# Altium integrated library WCAP-ATLL_rev15a.intlib: 209 symbols (part 1 of 3)
Pins are listed as number, name and electrical type; pins without a type are passive.

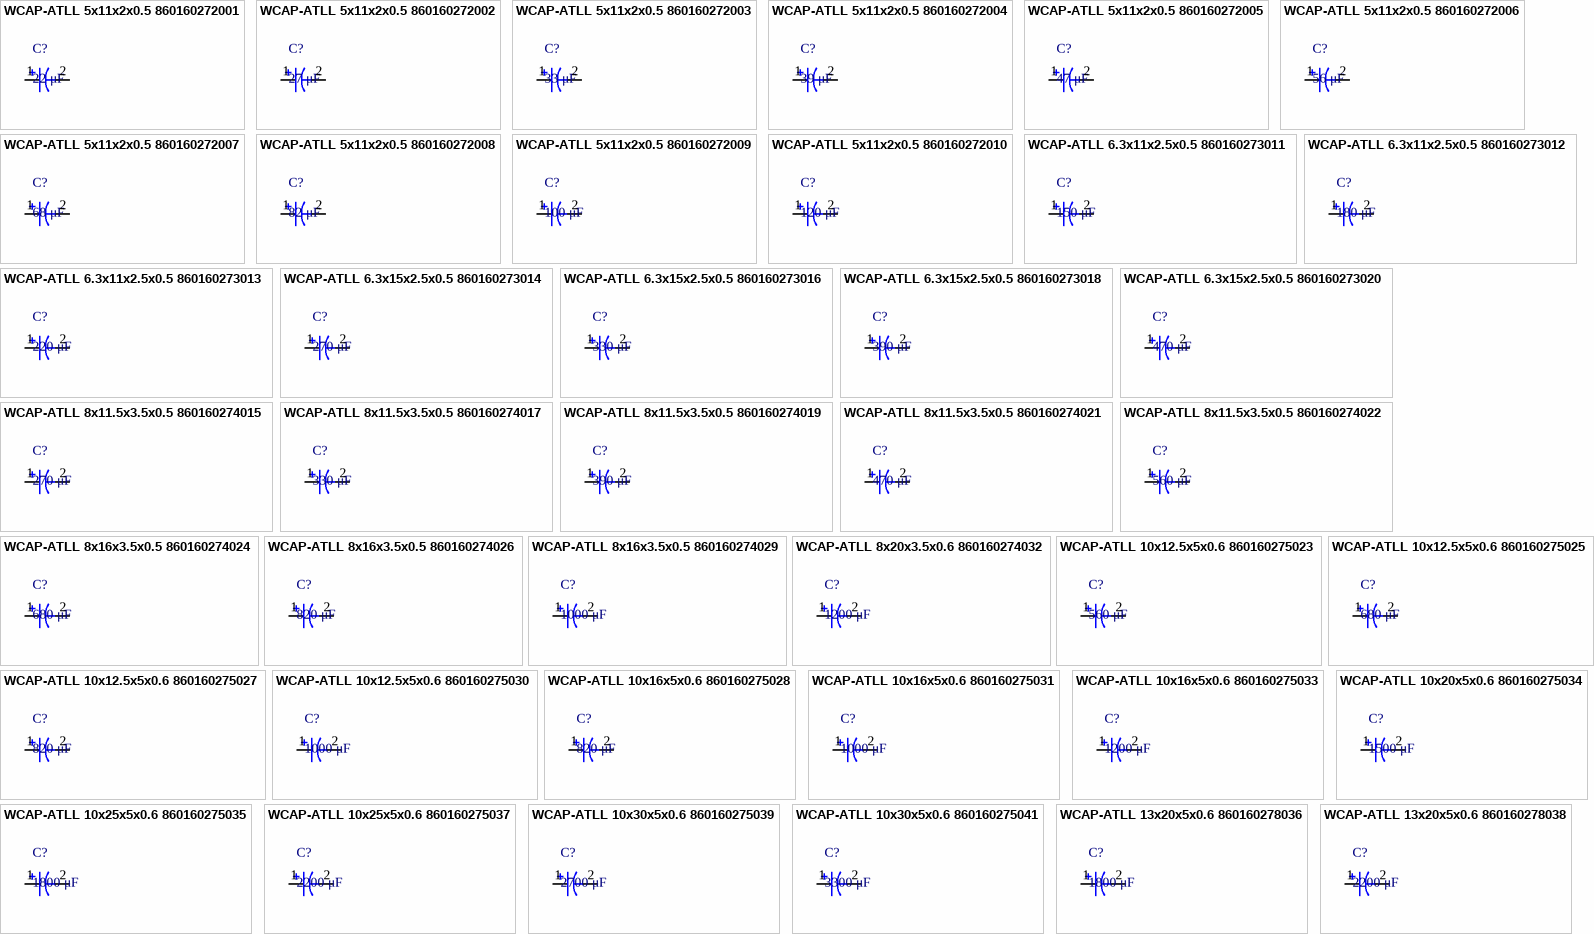
[diagram p0: symbols WCAP-ATLL 5x11x2x0.5 860160272001 to WCAP-ATLL 13x20x5x0.6 860160278038]

## WCAP-ATLL 5x11x2x0.5 860160272001
designator C?, comment 22 μF
WCAP-ATLL Aluminum Electrolytic Capacitors , 22 μF; + / - 20%; 10 V , 5 x 11; Manufacturer: Wurth Elektronik; partNo: 860160272001; E-mail: libraries@we-online.com; Characteristics: Aluminum Electrolytic Capacitor;Recommended soldering: Wave;Operating temperature: –55 °C to +105 °C;Low impedance and high temperature product series;Load life: 3000–10000 h @ +105 °C; ComponentLink1Description: Manufacturer; ComponentLink1URL: http://www.we-online.com; ComponentLink2Description: Datasheet; ComponentLink2URL: http://katalog.we-online.de/pbs/datasheet/860160272001.pdf; Created by: Karrer Zheng; Created Date: 5/13/2015; Capacitance: 22 μF; Application: Used in circuit with rigorous conditions and high ambient temperature;  applied to the secondary side output filtering loop, used in switching power supply with higher operating temperature, DC-DC converter, AC-DC converter, adapter, charger, TV, VCR, DC motor circuit filter, high-end switching power supply, LCD TV, energy saving lamps, electronic ballast, LED lamp and etc.
footprint WCAP-ATLL 5x11x2x0.5
pins: 1, 2

## WCAP-ATLL 5x11x2x0.5 860160272002
designator C?, comment 27 μF
WCAP-ATLL Aluminum Electrolytic Capacitors , 27 μF; + / - 20%; 10 V , 5 x 11; Manufacturer: Wurth Elektronik; partNo: 860160272002; E-mail: libraries@we-online.com; Characteristics: Aluminum Electrolytic Capacitor;Recommended soldering: Wave;Operating temperature: –55 °C to +105 °C;Low impedance and high temperature product series;Load life: 3000–10000 h @ +105 °C; ComponentLink1Description: Manufacturer; ComponentLink1URL: http://www.we-online.com; ComponentLink2Description: Datasheet; ComponentLink2URL: http://katalog.we-online.de/pbs/datasheet/860160272002.pdf; Created by: Karrer Zheng; Created Date: 5/13/2015; Capacitance: 27 μF; Application: Used in circuit with rigorous conditions and high ambient temperature;  applied to the secondary side output filtering loop, used in switching power supply with higher operating temperature, DC-DC converter, AC-DC converter, adapter, charger, TV, VCR, DC motor circuit filter, high-end switching power supply, LCD TV, energy saving lamps, electronic ballast, LED lamp and etc.
footprint WCAP-ATLL 5x11x2x0.5
pins: 1, 2

## WCAP-ATLL 5x11x2x0.5 860160272003
designator C?, comment 33 μF
WCAP-ATLL Aluminum Electrolytic Capacitors , 33 μF; + / - 20%; 10 V , 5 x 11; Manufacturer: Wurth Elektronik; partNo: 860160272003; E-mail: libraries@we-online.com; Characteristics: Aluminum Electrolytic Capacitor;Recommended soldering: Wave;Operating temperature: –55 °C to +105 °C;Low impedance and high temperature product series;Load life: 3000–10000 h @ +105 °C; ComponentLink1Description: Manufacturer; ComponentLink1URL: http://www.we-online.com; ComponentLink2Description: Datasheet; ComponentLink2URL: http://katalog.we-online.de/pbs/datasheet/860160272003.pdf; Created by: Karrer Zheng; Created Date: 5/13/2015; Capacitance: 33 μF; Application: Used in circuit with rigorous conditions and high ambient temperature;  applied to the secondary side output filtering loop, used in switching power supply with higher operating temperature, DC-DC converter, AC-DC converter, adapter, charger, TV, VCR, DC motor circuit filter, high-end switching power supply, LCD TV, energy saving lamps, electronic ballast, LED lamp and etc.
footprint WCAP-ATLL 5x11x2x0.5
pins: 1, 2

## WCAP-ATLL 5x11x2x0.5 860160272004
designator C?, comment 39 μF
WCAP-ATLL Aluminum Electrolytic Capacitors , 39 μF; + / - 20%; 10 V , 5 x 11; Manufacturer: Wurth Elektronik; partNo: 860160272004; E-mail: libraries@we-online.com; Characteristics: Aluminum Electrolytic Capacitor;Recommended soldering: Wave;Operating temperature: –55 °C to +105 °C;Low impedance and high temperature product series;Load life: 3000–10000 h @ +105 °C; ComponentLink1Description: Manufacturer; ComponentLink1URL: http://www.we-online.com; ComponentLink2Description: Datasheet; ComponentLink2URL: http://katalog.we-online.de/pbs/datasheet/860160272004.pdf; Created by: Karrer Zheng; Created Date: 5/13/2015; Capacitance: 39 μF; Application: Used in circuit with rigorous conditions and high ambient temperature;  applied to the secondary side output filtering loop, used in switching power supply with higher operating temperature, DC-DC converter, AC-DC converter, adapter, charger, TV, VCR, DC motor circuit filter, high-end switching power supply, LCD TV, energy saving lamps, electronic ballast, LED lamp and etc.
footprint WCAP-ATLL 5x11x2x0.5
pins: 1, 2

## WCAP-ATLL 5x11x2x0.5 860160272005
designator C?, comment 47 μF
WCAP-ATLL Aluminum Electrolytic Capacitors , 47 μF; + / - 20%; 10 V , 5 x 11; Manufacturer: Wurth Elektronik; partNo: 860160272005; E-mail: libraries@we-online.com; Characteristics: Aluminum Electrolytic Capacitor;Recommended soldering: Wave;Operating temperature: –55 °C to +105 °C;Low impedance and high temperature product series;Load life: 3000–10000 h @ +105 °C; ComponentLink1Description: Manufacturer; ComponentLink1URL: http://www.we-online.com; ComponentLink2Description: Datasheet; ComponentLink2URL: http://katalog.we-online.de/pbs/datasheet/860160272005.pdf; Created by: Karrer Zheng; Created Date: 5/13/2015; Capacitance: 47 μF; Application: Used in circuit with rigorous conditions and high ambient temperature;  applied to the secondary side output filtering loop, used in switching power supply with higher operating temperature, DC-DC converter, AC-DC converter, adapter, charger, TV, VCR, DC motor circuit filter, high-end switching power supply, LCD TV, energy saving lamps, electronic ballast, LED lamp and etc.
footprint WCAP-ATLL 5x11x2x0.5
pins: 1, 2

## WCAP-ATLL 5x11x2x0.5 860160272006
designator C?, comment 56 μF
WCAP-ATLL Aluminum Electrolytic Capacitors , 56 μF; + / - 20%; 10 V , 5 x 11; Manufacturer: Wurth Elektronik; partNo: 860160272006; E-mail: libraries@we-online.com; Characteristics: Aluminum Electrolytic Capacitor;Recommended soldering: Wave;Operating temperature: –55 °C to +105 °C;Low impedance and high temperature product series;Load life: 3000–10000 h @ +105 °C; ComponentLink1Description: Manufacturer; ComponentLink1URL: http://www.we-online.com; ComponentLink2Description: Datasheet; ComponentLink2URL: http://katalog.we-online.de/pbs/datasheet/860160272006.pdf; Created by: Karrer Zheng; Created Date: 5/13/2015; Capacitance: 56 μF; Application: Used in circuit with rigorous conditions and high ambient temperature;  applied to the secondary side output filtering loop, used in switching power supply with higher operating temperature, DC-DC converter, AC-DC converter, adapter, charger, TV, VCR, DC motor circuit filter, high-end switching power supply, LCD TV, energy saving lamps, electronic ballast, LED lamp and etc.
footprint WCAP-ATLL 5x11x2x0.5
pins: 1, 2

## WCAP-ATLL 5x11x2x0.5 860160272007
designator C?, comment 68 μF
WCAP-ATLL Aluminum Electrolytic Capacitors , 68 μF; + / - 20%; 10 V , 5 x 11; Manufacturer: Wurth Elektronik; partNo: 860160272007; E-mail: libraries@we-online.com; Characteristics: Aluminum Electrolytic Capacitor;Recommended soldering: Wave;Operating temperature: –55 °C to +105 °C;Low impedance and high temperature product series;Load life: 3000–10000 h @ +105 °C; ComponentLink1Description: Manufacturer; ComponentLink1URL: http://www.we-online.com; ComponentLink2Description: Datasheet; ComponentLink2URL: http://katalog.we-online.de/pbs/datasheet/860160272007.pdf; Created by: Karrer Zheng; Created Date: 5/13/2015; Capacitance: 68 μF; Application: Used in circuit with rigorous conditions and high ambient temperature;  applied to the secondary side output filtering loop, used in switching power supply with higher operating temperature, DC-DC converter, AC-DC converter, adapter, charger, TV, VCR, DC motor circuit filter, high-end switching power supply, LCD TV, energy saving lamps, electronic ballast, LED lamp and etc.
footprint WCAP-ATLL 5x11x2x0.5
pins: 1, 2

## WCAP-ATLL 5x11x2x0.5 860160272008
designator C?, comment 82 μF
WCAP-ATLL Aluminum Electrolytic Capacitors , 82 μF; + / - 20%; 10 V , 5 x 11; Manufacturer: Wurth Elektronik; partNo: 860160272008; E-mail: libraries@we-online.com; Characteristics: Aluminum Electrolytic Capacitor;Recommended soldering: Wave;Operating temperature: –55 °C to +105 °C;Low impedance and high temperature product series;Load life: 3000–10000 h @ +105 °C; ComponentLink1Description: Manufacturer; ComponentLink1URL: http://www.we-online.com; ComponentLink2Description: Datasheet; ComponentLink2URL: http://katalog.we-online.de/pbs/datasheet/860160272008.pdf; Created by: Karrer Zheng; Created Date: 5/13/2015; Capacitance: 82 μF; Application: Used in circuit with rigorous conditions and high ambient temperature;  applied to the secondary side output filtering loop, used in switching power supply with higher operating temperature, DC-DC converter, AC-DC converter, adapter, charger, TV, VCR, DC motor circuit filter, high-end switching power supply, LCD TV, energy saving lamps, electronic ballast, LED lamp and etc.
footprint WCAP-ATLL 5x11x2x0.5
pins: 1, 2

## WCAP-ATLL 5x11x2x0.5 860160272009
designator C?, comment 100 μF
WCAP-ATLL Aluminum Electrolytic Capacitors , 100 μF; + / - 20%; 10 V , 5 x 11; Manufacturer: Wurth Elektronik; partNo: 860160272009; E-mail: libraries@we-online.com; Characteristics: Aluminum Electrolytic Capacitor;Recommended soldering: Wave;Operating temperature: –55 °C to +105 °C;Low impedance and high temperature product series;Load life: 3000–10000 h @ +105 °C; ComponentLink1Description: Manufacturer; ComponentLink1URL: http://www.we-online.com; ComponentLink2Description: Datasheet; ComponentLink2URL: http://katalog.we-online.de/pbs/datasheet/860160272009.pdf; Created by: Karrer Zheng; Created Date: 5/13/2015; Capacitance: 100 μF; Application: Used in circuit with rigorous conditions and high ambient temperature;  applied to the secondary side output filtering loop, used in switching power supply with higher operating temperature, DC-DC converter, AC-DC converter, adapter, charger, TV, VCR, DC motor circuit filter, high-end switching power supply, LCD TV, energy saving lamps, electronic ballast, LED lamp and etc.
footprint WCAP-ATLL 5x11x2x0.5
pins: 1, 2

## WCAP-ATLL 5x11x2x0.5 860160272010
designator C?, comment 120 μF
WCAP-ATLL Aluminum Electrolytic Capacitors , 120 μF; + / - 20%; 10 V , 5 x 11; Manufacturer: Wurth Elektronik; partNo: 860160272010; E-mail: libraries@we-online.com; Characteristics: Aluminum Electrolytic Capacitor;Recommended soldering: Wave;Operating temperature: –55 °C to +105 °C;Low impedance and high temperature product series;Load life: 3000–10000 h @ +105 °C; ComponentLink1Description: Manufacturer; ComponentLink1URL: http://www.we-online.com; ComponentLink2Description: Datasheet; ComponentLink2URL: http://katalog.we-online.de/pbs/datasheet/860160272010.pdf; Created by: Karrer Zheng; Created Date: 5/13/2015; Capacitance: 120 μF; Application: Used in circuit with rigorous conditions and high ambient temperature;  applied to the secondary side output filtering loop, used in switching power supply with higher operating temperature, DC-DC converter, AC-DC converter, adapter, charger, TV, VCR, DC motor circuit filter, high-end switching power supply, LCD TV, energy saving lamps, electronic ballast, LED lamp and etc.
footprint WCAP-ATLL 5x11x2x0.5
pins: 1, 2

## WCAP-ATLL 6.3x11x2.5x0.5 860160273011
designator C?, comment 150 μF
WCAP-ATLL Aluminum Electrolytic Capacitors , 150 μF; + / - 20%; 10 V , 6,3 x 11; Manufacturer: Wurth Elektronik; partNo: 860160273011; E-mail: libraries@we-online.com; Characteristics: Aluminum Electrolytic Capacitor;Recommended soldering: Wave;Operating temperature: –55 °C to +105 °C;Low impedance and high temperature product series;Load life: 3000–10000 h @ +105 °C; ComponentLink1Description: Manufacturer; ComponentLink1URL: http://www.we-online.com; ComponentLink2Description: Datasheet; ComponentLink2URL: http://katalog.we-online.de/pbs/datasheet/860160273011.pdf; Created by: Karrer Zheng; Created Date: 5/13/2015; Capacitance: 150 μF; Application: Used in circuit with rigorous conditions and high ambient temperature;  applied to the secondary side output filtering loop, used in switching power supply with higher operating temperature, DC-DC converter, AC-DC converter, adapter, charger, TV, VCR, DC motor circuit filter, high-end switching power supply, LCD TV, energy saving lamps, electronic ballast, LED lamp and etc.
footprint WCAP-ATLL 6.3x11x2.5x0.5
pins: 1, 2

## WCAP-ATLL 6.3x11x2.5x0.5 860160273012
designator C?, comment 180 μF
WCAP-ATLL Aluminum Electrolytic Capacitors , 180 μF; + / - 20%; 10 V , 6,3 x 11; Manufacturer: Wurth Elektronik; partNo: 860160273012; E-mail: libraries@we-online.com; Characteristics: Aluminum Electrolytic Capacitor;Recommended soldering: Wave;Operating temperature: –55 °C to +105 °C;Low impedance and high temperature product series;Load life: 3000–10000 h @ +105 °C; ComponentLink1Description: Manufacturer; ComponentLink1URL: http://www.we-online.com; ComponentLink2Description: Datasheet; ComponentLink2URL: http://katalog.we-online.de/pbs/datasheet/860160273012.pdf; Created by: Karrer Zheng; Created Date: 5/13/2015; Capacitance: 180 μF; Application: Used in circuit with rigorous conditions and high ambient temperature;  applied to the secondary side output filtering loop, used in switching power supply with higher operating temperature, DC-DC converter, AC-DC converter, adapter, charger, TV, VCR, DC motor circuit filter, high-end switching power supply, LCD TV, energy saving lamps, electronic ballast, LED lamp and etc.
footprint WCAP-ATLL 6.3x11x2.5x0.5
pins: 1, 2

## WCAP-ATLL 6.3x11x2.5x0.5 860160273013
designator C?, comment 220 μF
WCAP-ATLL Aluminum Electrolytic Capacitors , 220 μF; + / - 20%; 10 V , 6,3 x 11; Manufacturer: Wurth Elektronik; partNo: 860160273013; E-mail: libraries@we-online.com; Characteristics: Aluminum Electrolytic Capacitor;Recommended soldering: Wave;Operating temperature: –55 °C to +105 °C;Low impedance and high temperature product series;Load life: 3000–10000 h @ +105 °C; ComponentLink1Description: Manufacturer; ComponentLink1URL: http://www.we-online.com; ComponentLink2Description: Datasheet; ComponentLink2URL: http://katalog.we-online.de/pbs/datasheet/860160273013.pdf; Created by: Karrer Zheng; Created Date: 5/13/2015; Capacitance: 220 μF; Application: Used in circuit with rigorous conditions and high ambient temperature;  applied to the secondary side output filtering loop, used in switching power supply with higher operating temperature, DC-DC converter, AC-DC converter, adapter, charger, TV, VCR, DC motor circuit filter, high-end switching power supply, LCD TV, energy saving lamps, electronic ballast, LED lamp and etc.
footprint WCAP-ATLL 6.3x11x2.5x0.5
pins: 1, 2

## WCAP-ATLL 6.3x15x2.5x0.5 860160273014
designator C?, comment 270 μF
WCAP-ATLL Aluminum Electrolytic Capacitors , 270 μF; + / - 20%; 10 V , 6,3 x 15; Manufacturer: Wurth Elektronik; partNo: 860160273014; E-mail: libraries@we-online.com; Characteristics: Aluminum Electrolytic Capacitor;Recommended soldering: Wave;Operating temperature: –55 °C to +105 °C;Low impedance and high temperature product series;Load life: 3000–10000 h @ +105 °C; ComponentLink1Description: Manufacturer; ComponentLink1URL: http://www.we-online.com; ComponentLink2Description: Datasheet; ComponentLink2URL: http://katalog.we-online.de/pbs/datasheet/860160273014.pdf; Created by: Karrer Zheng; Created Date: 5/13/2015; Capacitance: 270 μF; Application: Used in circuit with rigorous conditions and high ambient temperature;  applied to the secondary side output filtering loop, used in switching power supply with higher operating temperature, DC-DC converter, AC-DC converter, adapter, charger, TV, VCR, DC motor circuit filter, high-end switching power supply, LCD TV, energy saving lamps, electronic ballast, LED lamp and etc.
footprint WCAP-ATLL 6.3x15x2.5x0.5
pins: 1, 2

## WCAP-ATLL 6.3x15x2.5x0.5 860160273016
designator C?, comment 330 μF
WCAP-ATLL Aluminum Electrolytic Capacitors , 330 μF; + / - 20%; 10 V , 6,3 x 15; Manufacturer: Wurth Elektronik; partNo: 860160273016; E-mail: libraries@we-online.com; Characteristics: Aluminum Electrolytic Capacitor;Recommended soldering: Wave;Operating temperature: –55 °C to +105 °C;Low impedance and high temperature product series;Load life: 3000–10000 h @ +105 °C; ComponentLink1Description: Manufacturer; ComponentLink1URL: http://www.we-online.com; ComponentLink2Description: Datasheet; ComponentLink2URL: http://katalog.we-online.de/pbs/datasheet/860160273016.pdf; Created by: Karrer Zheng; Created Date: 5/13/2015; Capacitance: 330 μF; Application: Used in circuit with rigorous conditions and high ambient temperature;  applied to the secondary side output filtering loop, used in switching power supply with higher operating temperature, DC-DC converter, AC-DC converter, adapter, charger, TV, VCR, DC motor circuit filter, high-end switching power supply, LCD TV, energy saving lamps, electronic ballast, LED lamp and etc.
footprint WCAP-ATLL 6.3x15x2.5x0.5
pins: 1, 2

## WCAP-ATLL 6.3x15x2.5x0.5 860160273018
designator C?, comment 390 μF
WCAP-ATLL Aluminum Electrolytic Capacitors , 390 μF; + / - 20%; 10 V , 6,3 x 15; Manufacturer: Wurth Elektronik; partNo: 860160273018; E-mail: libraries@we-online.com; Characteristics: Aluminum Electrolytic Capacitor;Recommended soldering: Wave;Operating temperature: –55 °C to +105 °C;Low impedance and high temperature product series;Load life: 3000–10000 h @ +105 °C; ComponentLink1Description: Manufacturer; ComponentLink1URL: http://www.we-online.com; ComponentLink2Description: Datasheet; ComponentLink2URL: http://katalog.we-online.de/pbs/datasheet/860160273018.pdf; Created by: Karrer Zheng; Created Date: 5/13/2015; Capacitance: 390 μF; Application: Used in circuit with rigorous conditions and high ambient temperature;  applied to the secondary side output filtering loop, used in switching power supply with higher operating temperature, DC-DC converter, AC-DC converter, adapter, charger, TV, VCR, DC motor circuit filter, high-end switching power supply, LCD TV, energy saving lamps, electronic ballast, LED lamp and etc.
footprint WCAP-ATLL 6.3x15x2.5x0.5
pins: 1, 2

## WCAP-ATLL 6.3x15x2.5x0.5 860160273020
designator C?, comment 470 μF
WCAP-ATLL Aluminum Electrolytic Capacitors , 470 μF; + / - 20%; 10 V , 6,3 x 15; Manufacturer: Wurth Elektronik; partNo: 860160273020; E-mail: libraries@we-online.com; Characteristics: Aluminum Electrolytic Capacitor;Recommended soldering: Wave;Operating temperature: –55 °C to +105 °C;Low impedance and high temperature product series;Load life: 3000–10000 h @ +105 °C; ComponentLink1Description: Manufacturer; ComponentLink1URL: http://www.we-online.com; ComponentLink2Description: Datasheet; ComponentLink2URL: http://katalog.we-online.de/pbs/datasheet/860160273020.pdf; Created by: Karrer Zheng; Created Date: 5/13/2015; Capacitance: 470 μF; Application: Used in circuit with rigorous conditions and high ambient temperature;  applied to the secondary side output filtering loop, used in switching power supply with higher operating temperature, DC-DC converter, AC-DC converter, adapter, charger, TV, VCR, DC motor circuit filter, high-end switching power supply, LCD TV, energy saving lamps, electronic ballast, LED lamp and etc.
footprint WCAP-ATLL 6.3x15x2.5x0.5
pins: 1, 2

## WCAP-ATLL 8x11.5x3.5x0.5 860160274015
designator C?, comment 270 μF
WCAP-ATLL Aluminum Electrolytic Capacitors , 270 μF; + / - 20%; 10 V , 8 x 11,5; Manufacturer: Wurth Elektronik; partNo: 860160274015; E-mail: libraries@we-online.com; Characteristics: Aluminum Electrolytic Capacitor;Recommended soldering: Wave;Operating temperature: –55 °C to +105 °C;Low impedance and high temperature product series;Load life: 3000–10000 h @ +105 °C; ComponentLink1Description: Manufacturer; ComponentLink1URL: http://www.we-online.com; ComponentLink2Description: Datasheet; ComponentLink2URL: http://katalog.we-online.de/pbs/datasheet/860160274015.pdf; Created by: Karrer Zheng; Created Date: 5/13/2015; Capacitance: 270 μF; Application: Used in circuit with rigorous conditions and high ambient temperature;  applied to the secondary side output filtering loop, used in switching power supply with higher operating temperature, DC-DC converter, AC-DC converter, adapter, charger, TV, VCR, DC motor circuit filter, high-end switching power supply, LCD TV, energy saving lamps, electronic ballast, LED lamp and etc.
footprint WCAP-ATLL 8x11.5x3.5x0.5
pins: 1, 2

## WCAP-ATLL 8x11.5x3.5x0.5 860160274017
designator C?, comment 330 μF
WCAP-ATLL Aluminum Electrolytic Capacitors , 330 μF; + / - 20%; 10 V , 8 x 11,5; Manufacturer: Wurth Elektronik; partNo: 860160274017; E-mail: libraries@we-online.com; Characteristics: Aluminum Electrolytic Capacitor;Recommended soldering: Wave;Operating temperature: –55 °C to +105 °C;Low impedance and high temperature product series;Load life: 3000–10000 h @ +105 °C; ComponentLink1Description: Manufacturer; ComponentLink1URL: http://www.we-online.com; ComponentLink2Description: Datasheet; ComponentLink2URL: http://katalog.we-online.de/pbs/datasheet/860160274017.pdf; Created by: Karrer Zheng; Created Date: 5/13/2015; Capacitance: 330 μF; Application: Used in circuit with rigorous conditions and high ambient temperature;  applied to the secondary side output filtering loop, used in switching power supply with higher operating temperature, DC-DC converter, AC-DC converter, adapter, charger, TV, VCR, DC motor circuit filter, high-end switching power supply, LCD TV, energy saving lamps, electronic ballast, LED lamp and etc.
footprint WCAP-ATLL 8x11.5x3.5x0.5
pins: 1, 2

## WCAP-ATLL 8x11.5x3.5x0.5 860160274019
designator C?, comment 390 μF
WCAP-ATLL Aluminum Electrolytic Capacitors , 390 μF; + / - 20%; 10 V , 8 x 11,5; Manufacturer: Wurth Elektronik; partNo: 860160274019; E-mail: libraries@we-online.com; Characteristics: Aluminum Electrolytic Capacitor;Recommended soldering: Wave;Operating temperature: –55 °C to +105 °C;Low impedance and high temperature product series;Load life: 3000–10000 h @ +105 °C; ComponentLink1Description: Manufacturer; ComponentLink1URL: http://www.we-online.com; ComponentLink2Description: Datasheet; ComponentLink2URL: http://katalog.we-online.de/pbs/datasheet/860160274019.pdf; Created by: Karrer Zheng; Created Date: 5/13/2015; Capacitance: 390 μF; Application: Used in circuit with rigorous conditions and high ambient temperature;  applied to the secondary side output filtering loop, used in switching power supply with higher operating temperature, DC-DC converter, AC-DC converter, adapter, charger, TV, VCR, DC motor circuit filter, high-end switching power supply, LCD TV, energy saving lamps, electronic ballast, LED lamp and etc.
footprint WCAP-ATLL 8x11.5x3.5x0.5
pins: 1, 2

## WCAP-ATLL 8x11.5x3.5x0.5 860160274021
designator C?, comment 470 μF
WCAP-ATLL Aluminum Electrolytic Capacitors , 470 μF; + / - 20%; 10 V , 8 x 11,5; Manufacturer: Wurth Elektronik; partNo: 860160274021; E-mail: libraries@we-online.com; Characteristics: Aluminum Electrolytic Capacitor;Recommended soldering: Wave;Operating temperature: –55 °C to +105 °C;Low impedance and high temperature product series;Load life: 3000–10000 h @ +105 °C; ComponentLink1Description: Manufacturer; ComponentLink1URL: http://www.we-online.com; ComponentLink2Description: Datasheet; ComponentLink2URL: http://katalog.we-online.de/pbs/datasheet/860160274021.pdf; Created by: Karrer Zheng; Created Date: 5/13/2015; Capacitance: 470 μF; Application: Used in circuit with rigorous conditions and high ambient temperature;  applied to the secondary side output filtering loop, used in switching power supply with higher operating temperature, DC-DC converter, AC-DC converter, adapter, charger, TV, VCR, DC motor circuit filter, high-end switching power supply, LCD TV, energy saving lamps, electronic ballast, LED lamp and etc.
footprint WCAP-ATLL 8x11.5x3.5x0.5
pins: 1, 2

## WCAP-ATLL 8x11.5x3.5x0.5 860160274022
designator C?, comment 560 μF
WCAP-ATLL Aluminum Electrolytic Capacitors , 560 μF; + / - 20%; 10 V , 8 x 11,5; Manufacturer: Wurth Elektronik; partNo: 860160274022; E-mail: libraries@we-online.com; Characteristics: Aluminum Electrolytic Capacitor;Recommended soldering: Wave;Operating temperature: –55 °C to +105 °C;Low impedance and high temperature product series;Load life: 3000–10000 h @ +105 °C; ComponentLink1Description: Manufacturer; ComponentLink1URL: http://www.we-online.com; ComponentLink2Description: Datasheet; ComponentLink2URL: http://katalog.we-online.de/pbs/datasheet/860160274022.pdf; Created by: Karrer Zheng; Created Date: 5/13/2015; Capacitance: 560 μF; Application: Used in circuit with rigorous conditions and high ambient temperature;  applied to the secondary side output filtering loop, used in switching power supply with higher operating temperature, DC-DC converter, AC-DC converter, adapter, charger, TV, VCR, DC motor circuit filter, high-end switching power supply, LCD TV, energy saving lamps, electronic ballast, LED lamp and etc.
footprint WCAP-ATLL 8x11.5x3.5x0.5
pins: 1, 2

## WCAP-ATLL 8x16x3.5x0.5 860160274024
designator C?, comment 680 μF
WCAP-ATLL Aluminum Electrolytic Capacitors , 680 μF; + / - 20%; 10 V , 8 x 16; Manufacturer: Wurth Elektronik; partNo: 860160274024; E-mail: libraries@we-online.com; Characteristics: Aluminum Electrolytic Capacitor;Recommended soldering: Wave;Operating temperature: –55 °C to +105 °C;Low impedance and high temperature product series;Load life: 3000–10000 h @ +105 °C; ComponentLink1Description: Manufacturer; ComponentLink1URL: http://www.we-online.com; ComponentLink2Description: Datasheet; ComponentLink2URL: http://katalog.we-online.de/pbs/datasheet/860160274024.pdf; Created by: Karrer Zheng; Created Date: 5/13/2015; Capacitance: 680 μF; Application: Used in circuit with rigorous conditions and high ambient temperature;  applied to the secondary side output filtering loop, used in switching power supply with higher operating temperature, DC-DC converter, AC-DC converter, adapter, charger, TV, VCR, DC motor circuit filter, high-end switching power supply, LCD TV, energy saving lamps, electronic ballast, LED lamp and etc.
footprint WCAP-ATLL 8x16x3.5x0.5
pins: 1, 2

## WCAP-ATLL 8x16x3.5x0.5 860160274026
designator C?, comment 820 μF
WCAP-ATLL Aluminum Electrolytic Capacitors , 820 μF; + / - 20%; 10 V , 8 x 16; Manufacturer: Wurth Elektronik; partNo: 860160274026; E-mail: libraries@we-online.com; Characteristics: Aluminum Electrolytic Capacitor;Recommended soldering: Wave;Operating temperature: –55 °C to +105 °C;Low impedance and high temperature product series;Load life: 3000–10000 h @ +105 °C; ComponentLink1Description: Manufacturer; ComponentLink1URL: http://www.we-online.com; ComponentLink2Description: Datasheet; ComponentLink2URL: http://katalog.we-online.de/pbs/datasheet/860160274026.pdf; Created by: Karrer Zheng; Created Date: 5/13/2015; Capacitance: 820 μF; Application: Used in circuit with rigorous conditions and high ambient temperature;  applied to the secondary side output filtering loop, used in switching power supply with higher operating temperature, DC-DC converter, AC-DC converter, adapter, charger, TV, VCR, DC motor circuit filter, high-end switching power supply, LCD TV, energy saving lamps, electronic ballast, LED lamp and etc.
footprint WCAP-ATLL 8x16x3.5x0.5
pins: 1, 2

## WCAP-ATLL 8x16x3.5x0.5 860160274029
designator C?, comment 1000 μF
WCAP-ATLL Aluminum Electrolytic Capacitors , 1000 μF; + / - 20%; 10 V , 8 x 16; Manufacturer: Wurth Elektronik; partNo: 860160274029; E-mail: libraries@we-online.com; Characteristics: Aluminum Electrolytic Capacitor;Recommended soldering: Wave;Operating temperature: –55 °C to +105 °C;Low impedance and high temperature product series;Load life: 3000–10000 h @ +105 °C; ComponentLink1Description: Manufacturer; ComponentLink1URL: http://www.we-online.com; ComponentLink2Description: Datasheet; ComponentLink2URL: http://katalog.we-online.de/pbs/datasheet/860160274029.pdf; Created by: Karrer Zheng; Created Date: 5/13/2015; Capacitance: 1000 μF; Application: Used in circuit with rigorous conditions and high ambient temperature;  applied to the secondary side output filtering loop, used in switching power supply with higher operating temperature, DC-DC converter, AC-DC converter, adapter, charger, TV, VCR, DC motor circuit filter, high-end switching power supply, LCD TV, energy saving lamps, electronic ballast, LED lamp and etc.
footprint WCAP-ATLL 8x16x3.5x0.5
pins: 1, 2

## WCAP-ATLL 8x20x3.5x0.6 860160274032
designator C?, comment 1200 μF
WCAP-ATLL Aluminum Electrolytic Capacitors , 1200 μF; + / - 20%; 10 V , 8 x 20; Manufacturer: Wurth Elektronik; partNo: 860160274032; E-mail: libraries@we-online.com; Characteristics: Aluminum Electrolytic Capacitor;Recommended soldering: Wave;Operating temperature: –55 °C to +105 °C;Low impedance and high temperature product series;Load life: 3000–10000 h @ +105 °C; ComponentLink1Description: Manufacturer; ComponentLink1URL: http://www.we-online.com; ComponentLink2Description: Datasheet; ComponentLink2URL: http://katalog.we-online.de/pbs/datasheet/860160274032.pdf; Created by: Karrer Zheng; Created Date: 5/13/2015; Capacitance: 1200 μF; Application: Used in circuit with rigorous conditions and high ambient temperature;  applied to the secondary side output filtering loop, used in switching power supply with higher operating temperature, DC-DC converter, AC-DC converter, adapter, charger, TV, VCR, DC motor circuit filter, high-end switching power supply, LCD TV, energy saving lamps, electronic ballast, LED lamp and etc.
footprint WCAP-ATLL 8x20x3.5x0.6
pins: 1, 2

## WCAP-ATLL 10x12.5x5x0.6 860160275023
designator C?, comment 560 μF
WCAP-ATLL Aluminum Electrolytic Capacitors , 560 μF; + / - 20%; 10 V , 10 x 12,5; Manufacturer: Wurth Elektronik; partNo: 860160275023; E-mail: libraries@we-online.com; Characteristics: Aluminum Electrolytic Capacitor;Recommended soldering: Wave;Operating temperature: –55 °C to +105 °C;Low impedance and high temperature product series;Load life: 3000–10000 h @ +105 °C; ComponentLink1Description: Manufacturer; ComponentLink1URL: http://www.we-online.com; ComponentLink2Description: Datasheet; ComponentLink2URL: http://katalog.we-online.de/pbs/datasheet/860160275023.pdf; Created by: Karrer Zheng; Created Date: 5/13/2015; Capacitance: 560 μF; Application: Used in circuit with rigorous conditions and high ambient temperature;  applied to the secondary side output filtering loop, used in switching power supply with higher operating temperature, DC-DC converter, AC-DC converter, adapter, charger, TV, VCR, DC motor circuit filter, high-end switching power supply, LCD TV, energy saving lamps, electronic ballast, LED lamp and etc.
footprint WCAP-ATLL 10x12.5x5x0.6
pins: 1, 2

## WCAP-ATLL 10x12.5x5x0.6 860160275025
designator C?, comment 680 μF
WCAP-ATLL Aluminum Electrolytic Capacitors , 680 μF; + / - 20%; 10 V , 10 x 12,5; Manufacturer: Wurth Elektronik; partNo: 860160275025; E-mail: libraries@we-online.com; Characteristics: Aluminum Electrolytic Capacitor;Recommended soldering: Wave;Operating temperature: –55 °C to +105 °C;Low impedance and high temperature product series;Load life: 3000–10000 h @ +105 °C; ComponentLink1Description: Manufacturer; ComponentLink1URL: http://www.we-online.com; ComponentLink2Description: Datasheet; ComponentLink2URL: http://katalog.we-online.de/pbs/datasheet/860160275025.pdf; Created by: Karrer Zheng; Created Date: 5/13/2015; Capacitance: 680 μF; Application: Used in circuit with rigorous conditions and high ambient temperature;  applied to the secondary side output filtering loop, used in switching power supply with higher operating temperature, DC-DC converter, AC-DC converter, adapter, charger, TV, VCR, DC motor circuit filter, high-end switching power supply, LCD TV, energy saving lamps, electronic ballast, LED lamp and etc.
footprint WCAP-ATLL 10x12.5x5x0.6
pins: 1, 2

## WCAP-ATLL 10x12.5x5x0.6 860160275027
designator C?, comment 820 μF
WCAP-ATLL Aluminum Electrolytic Capacitors , 820 μF; + / - 20%; 10 V , 10 x 12,5; Manufacturer: Wurth Elektronik; partNo: 860160275027; E-mail: libraries@we-online.com; Characteristics: Aluminum Electrolytic Capacitor;Recommended soldering: Wave;Operating temperature: –55 °C to +105 °C;Low impedance and high temperature product series;Load life: 3000–10000 h @ +105 °C; ComponentLink1Description: Manufacturer; ComponentLink1URL: http://www.we-online.com; ComponentLink2Description: Datasheet; ComponentLink2URL: http://katalog.we-online.de/pbs/datasheet/860160275027.pdf; Created by: Karrer Zheng; Created Date: 5/13/2015; Capacitance: 820 μF; Application: Used in circuit with rigorous conditions and high ambient temperature;  applied to the secondary side output filtering loop, used in switching power supply with higher operating temperature, DC-DC converter, AC-DC converter, adapter, charger, TV, VCR, DC motor circuit filter, high-end switching power supply, LCD TV, energy saving lamps, electronic ballast, LED lamp and etc.
footprint WCAP-ATLL 10x12.5x5x0.6
pins: 1, 2

## WCAP-ATLL 10x12.5x5x0.6 860160275030
designator C?, comment 1000 μF
WCAP-ATLL Aluminum Electrolytic Capacitors , 1000 μF; + / - 20%; 10 V , 10 x 12,5; Manufacturer: Wurth Elektronik; partNo: 860160275030; E-mail: libraries@we-online.com; Characteristics: Aluminum Electrolytic Capacitor;Recommended soldering: Wave;Operating temperature: –55 °C to +105 °C;Low impedance and high temperature product series;Load life: 3000–10000 h @ +105 °C; ComponentLink1Description: Manufacturer; ComponentLink1URL: http://www.we-online.com; ComponentLink2Description: Datasheet; ComponentLink2URL: http://katalog.we-online.de/pbs/datasheet/860160275030.pdf; Created by: Karrer Zheng; Created Date: 5/13/2015; Capacitance: 1000 μF; Application: Used in circuit with rigorous conditions and high ambient temperature;  applied to the secondary side output filtering loop, used in switching power supply with higher operating temperature, DC-DC converter, AC-DC converter, adapter, charger, TV, VCR, DC motor circuit filter, high-end switching power supply, LCD TV, energy saving lamps, electronic ballast, LED lamp and etc.
footprint WCAP-ATLL 10x12.5x5x0.6
pins: 1, 2

## WCAP-ATLL 10x16x5x0.6 860160275028
designator C?, comment 820 μF
WCAP-ATLL Aluminum Electrolytic Capacitors , 820 μF; + / - 20%; 10 V , 10 x 16; Manufacturer: Wurth Elektronik; partNo: 860160275028; E-mail: libraries@we-online.com; Characteristics: Aluminum Electrolytic Capacitor;Recommended soldering: Wave;Operating temperature: –55 °C to +105 °C;Low impedance and high temperature product series;Load life: 3000–10000 h @ +105 °C; ComponentLink1Description: Manufacturer; ComponentLink1URL: http://www.we-online.com; ComponentLink2Description: Datasheet; ComponentLink2URL: http://katalog.we-online.de/pbs/datasheet/860160275028.pdf; Created by: Karrer Zheng; Created Date: 5/13/2015; Capacitance: 820 μF; Application: Used in circuit with rigorous conditions and high ambient temperature;  applied to the secondary side output filtering loop, used in switching power supply with higher operating temperature, DC-DC converter, AC-DC converter, adapter, charger, TV, VCR, DC motor circuit filter, high-end switching power supply, LCD TV, energy saving lamps, electronic ballast, LED lamp and etc.
footprint WCAP-ATLL 10x16x5x0.6
pins: 1, 2

## WCAP-ATLL 10x16x5x0.6 860160275031
designator C?, comment 1000 μF
WCAP-ATLL Aluminum Electrolytic Capacitors , 1000 μF; + / - 20%; 10 V , 10 x 16; Manufacturer: Wurth Elektronik; partNo: 860160275031; E-mail: libraries@we-online.com; Characteristics: Aluminum Electrolytic Capacitor;Recommended soldering: Wave;Operating temperature: –55 °C to +105 °C;Low impedance and high temperature product series;Load life: 3000–10000 h @ +105 °C; ComponentLink1Description: Manufacturer; ComponentLink1URL: http://www.we-online.com; ComponentLink2Description: Datasheet; ComponentLink2URL: http://katalog.we-online.de/pbs/datasheet/860160275031.pdf; Created by: Karrer Zheng; Created Date: 5/13/2015; Capacitance: 1000 μF; Application: Used in circuit with rigorous conditions and high ambient temperature;  applied to the secondary side output filtering loop, used in switching power supply with higher operating temperature, DC-DC converter, AC-DC converter, adapter, charger, TV, VCR, DC motor circuit filter, high-end switching power supply, LCD TV, energy saving lamps, electronic ballast, LED lamp and etc.
footprint WCAP-ATLL 10x16x5x0.6
pins: 1, 2

## WCAP-ATLL 10x16x5x0.6 860160275033
designator C?, comment 1200 μF
WCAP-ATLL Aluminum Electrolytic Capacitors , 1200 μF; + / - 20%; 10 V , 10 x 16; Manufacturer: Wurth Elektronik; partNo: 860160275033; E-mail: libraries@we-online.com; Characteristics: Aluminum Electrolytic Capacitor;Recommended soldering: Wave;Operating temperature: –55 °C to +105 °C;Low impedance and high temperature product series;Load life: 3000–10000 h @ +105 °C; ComponentLink1Description: Manufacturer; ComponentLink1URL: http://www.we-online.com; ComponentLink2Description: Datasheet; ComponentLink2URL: http://katalog.we-online.de/pbs/datasheet/860160275033.pdf; Created by: Karrer Zheng; Created Date: 5/13/2015; Capacitance: 1200 μF; Application: Used in circuit with rigorous conditions and high ambient temperature;  applied to the secondary side output filtering loop, used in switching power supply with higher operating temperature, DC-DC converter, AC-DC converter, adapter, charger, TV, VCR, DC motor circuit filter, high-end switching power supply, LCD TV, energy saving lamps, electronic ballast, LED lamp and etc.
footprint WCAP-ATLL 10x16x5x0.6
pins: 1, 2

## WCAP-ATLL 10x20x5x0.6 860160275034
designator C?, comment 1500 μF
WCAP-ATLL Aluminum Electrolytic Capacitors , 1500 μF; + / - 20%; 10 V , 10 x 20; Manufacturer: Wurth Elektronik; partNo: 860160275034; E-mail: libraries@we-online.com; Characteristics: Aluminum Electrolytic Capacitor;Recommended soldering: Wave;Operating temperature: –55 °C to +105 °C;Low impedance and high temperature product series;Load life: 3000–10000 h @ +105 °C; ComponentLink1Description: Manufacturer; ComponentLink1URL: http://www.we-online.com; ComponentLink2Description: Datasheet; ComponentLink2URL: http://katalog.we-online.de/pbs/datasheet/860160275034.pdf; Created by: Karrer Zheng; Created Date: 5/13/2015; Capacitance: 1500 μF; Application: Used in circuit with rigorous conditions and high ambient temperature;  applied to the secondary side output filtering loop, used in switching power supply with higher operating temperature, DC-DC converter, AC-DC converter, adapter, charger, TV, VCR, DC motor circuit filter, high-end switching power supply, LCD TV, energy saving lamps, electronic ballast, LED lamp and etc.
footprint WCAP-ATLL 10x20x5x0.6
pins: 1, 2

## WCAP-ATLL 10x25x5x0.6 860160275035
designator C?, comment 1800 μF
WCAP-ATLL Aluminum Electrolytic Capacitors , 1800 μF; + / - 20%; 10 V , 10 x 25; Manufacturer: Wurth Elektronik; partNo: 860160275035; E-mail: libraries@we-online.com; Characteristics: Aluminum Electrolytic Capacitor;Recommended soldering: Wave;Operating temperature: –55 °C to +105 °C;Low impedance and high temperature product series;Load life: 3000–10000 h @ +105 °C; ComponentLink1Description: Manufacturer; ComponentLink1URL: http://www.we-online.com; ComponentLink2Description: Datasheet; ComponentLink2URL: http://katalog.we-online.de/pbs/datasheet/860160275035.pdf; Created by: Karrer Zheng; Created Date: 5/13/2015; Capacitance: 1800 μF; Application: Used in circuit with rigorous conditions and high ambient temperature;  applied to the secondary side output filtering loop, used in switching power supply with higher operating temperature, DC-DC converter, AC-DC converter, adapter, charger, TV, VCR, DC motor circuit filter, high-end switching power supply, LCD TV, energy saving lamps, electronic ballast, LED lamp and etc.
footprint WCAP-ATLL 10x25x5x0.6
pins: 1, 2

## WCAP-ATLL 10x25x5x0.6 860160275037
designator C?, comment 2200 μF
WCAP-ATLL Aluminum Electrolytic Capacitors , 2200 μF; + / - 20%; 10 V , 10 x 25; Manufacturer: Wurth Elektronik; partNo: 860160275037; E-mail: libraries@we-online.com; Characteristics: Aluminum Electrolytic Capacitor;Recommended soldering: Wave;Operating temperature: –55 °C to +105 °C;Low impedance and high temperature product series;Load life: 3000–10000 h @ +105 °C; ComponentLink1Description: Manufacturer; ComponentLink1URL: http://www.we-online.com; ComponentLink2Description: Datasheet; ComponentLink2URL: http://katalog.we-online.de/pbs/datasheet/860160275037.pdf; Created by: Karrer Zheng; Created Date: 5/13/2015; Capacitance: 2200 μF; Application: Used in circuit with rigorous conditions and high ambient temperature;  applied to the secondary side output filtering loop, used in switching power supply with higher operating temperature, DC-DC converter, AC-DC converter, adapter, charger, TV, VCR, DC motor circuit filter, high-end switching power supply, LCD TV, energy saving lamps, electronic ballast, LED lamp and etc.
footprint WCAP-ATLL 10x25x5x0.6
pins: 1, 2

## WCAP-ATLL 10x30x5x0.6 860160275039
designator C?, comment 2700 μF
WCAP-ATLL Aluminum Electrolytic Capacitors , 2700 μF; + / - 20%; 10 V , 10 x 30; Manufacturer: Wurth Elektronik; partNo: 860160275039; E-mail: libraries@we-online.com; Characteristics: Aluminum Electrolytic Capacitor;Recommended soldering: Wave;Operating temperature: –55 °C to +105 °C;Low impedance and high temperature product series;Load life: 3000–10000 h @ +105 °C; ComponentLink1Description: Manufacturer; ComponentLink1URL: http://www.we-online.com; ComponentLink2Description: Datasheet; ComponentLink2URL: http://katalog.we-online.de/pbs/datasheet/860160275039.pdf; Created by: Karrer Zheng; Created Date: 5/13/2015; Capacitance: 2700 μF; Application: Used in circuit with rigorous conditions and high ambient temperature;  applied to the secondary side output filtering loop, used in switching power supply with higher operating temperature, DC-DC converter, AC-DC converter, adapter, charger, TV, VCR, DC motor circuit filter, high-end switching power supply, LCD TV, energy saving lamps, electronic ballast, LED lamp and etc.
footprint WCAP-ATLL 10x30x5x0.6
pins: 1, 2

## WCAP-ATLL 10x30x5x0.6 860160275041
designator C?, comment 3300 μF
WCAP-ATLL Aluminum Electrolytic Capacitors , 3300 μF; + / - 20%; 10 V , 10 x 30; Manufacturer: Wurth Elektronik; partNo: 860160275041; E-mail: libraries@we-online.com; Characteristics: Aluminum Electrolytic Capacitor;Recommended soldering: Wave;Operating temperature: –55 °C to +105 °C;Low impedance and high temperature product series;Load life: 3000–10000 h @ +105 °C; ComponentLink1Description: Manufacturer; ComponentLink1URL: http://www.we-online.com; ComponentLink2Description: Datasheet; ComponentLink2URL: http://katalog.we-online.de/pbs/datasheet/860160275041.pdf; Created by: Karrer Zheng; Created Date: 5/13/2015; Capacitance: 3300 μF; Application: Used in circuit with rigorous conditions and high ambient temperature;  applied to the secondary side output filtering loop, used in switching power supply with higher operating temperature, DC-DC converter, AC-DC converter, adapter, charger, TV, VCR, DC motor circuit filter, high-end switching power supply, LCD TV, energy saving lamps, electronic ballast, LED lamp and etc.
footprint WCAP-ATLL 10x30x5x0.6
pins: 1, 2

## WCAP-ATLL 13x20x5x0.6 860160278036
designator C?, comment 1800 μF
WCAP-ATLL Aluminum Electrolytic Capacitors , 1800 μF; + / - 20%; 10 V , 13 x 20; Manufacturer: Wurth Elektronik; partNo: 860160278036; E-mail: libraries@we-online.com; Characteristics: Aluminum Electrolytic Capacitor;Recommended soldering: Wave;Operating temperature: –55 °C to +105 °C;Low impedance and high temperature product series;Load life: 3000–10000 h @ +105 °C; ComponentLink1Description: Manufacturer; ComponentLink1URL: http://www.we-online.com; ComponentLink2Description: Datasheet; ComponentLink2URL: http://katalog.we-online.de/pbs/datasheet/860160278036.pdf; Created by: Karrer Zheng; Created Date: 5/13/2015; Capacitance: 1800 μF; Application: Used in circuit with rigorous conditions and high ambient temperature;  applied to the secondary side output filtering loop, used in switching power supply with higher operating temperature, DC-DC converter, AC-DC converter, adapter, charger, TV, VCR, DC motor circuit filter, high-end switching power supply, LCD TV, energy saving lamps, electronic ballast, LED lamp and etc.
footprint WCAP-ATLL 13x20x5x0.6
pins: 1, 2

## WCAP-ATLL 13x20x5x0.6 860160278038
designator C?, comment 2200 μF
WCAP-ATLL Aluminum Electrolytic Capacitors , 2200 μF; + / - 20%; 10 V , 13 x 20; Manufacturer: Wurth Elektronik; partNo: 860160278038; E-mail: libraries@we-online.com; Characteristics: Aluminum Electrolytic Capacitor;Recommended soldering: Wave;Operating temperature: –55 °C to +105 °C;Low impedance and high temperature product series;Load life: 3000–10000 h @ +105 °C; ComponentLink1Description: Manufacturer; ComponentLink1URL: http://www.we-online.com; ComponentLink2Description: Datasheet; ComponentLink2URL: http://katalog.we-online.de/pbs/datasheet/860160278038.pdf; Created by: Karrer Zheng; Created Date: 5/13/2015; Capacitance: 2200 μF; Application: Used in circuit with rigorous conditions and high ambient temperature;  applied to the secondary side output filtering loop, used in switching power supply with higher operating temperature, DC-DC converter, AC-DC converter, adapter, charger, TV, VCR, DC motor circuit filter, high-end switching power supply, LCD TV, energy saving lamps, electronic ballast, LED lamp and etc.
footprint WCAP-ATLL 13x20x5x0.6
pins: 1, 2

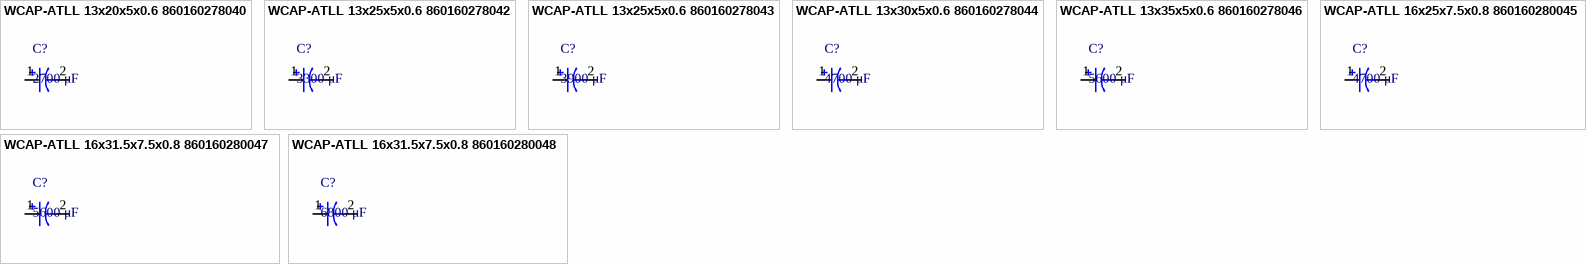
[diagram p1: symbols WCAP-ATLL 13x20x5x0.6 860160278040 to WCAP-ATLL 16x31.5x7.5x0.8 860160280048]

## WCAP-ATLL 13x20x5x0.6 860160278040
designator C?, comment 2700 μF
WCAP-ATLL Aluminum Electrolytic Capacitors , 2700 μF; + / - 20%; 10 V , 13 x 20; Manufacturer: Wurth Elektronik; partNo: 860160278040; E-mail: libraries@we-online.com; Characteristics: Aluminum Electrolytic Capacitor;Recommended soldering: Wave;Operating temperature: –55 °C to +105 °C;Low impedance and high temperature product series;Load life: 3000–10000 h @ +105 °C; ComponentLink1Description: Manufacturer; ComponentLink1URL: http://www.we-online.com; ComponentLink2Description: Datasheet; ComponentLink2URL: http://katalog.we-online.de/pbs/datasheet/860160278040.pdf; Created by: Karrer Zheng; Created Date: 5/13/2015; Capacitance: 2700 μF; Application: Used in circuit with rigorous conditions and high ambient temperature;  applied to the secondary side output filtering loop, used in switching power supply with higher operating temperature, DC-DC converter, AC-DC converter, adapter, charger, TV, VCR, DC motor circuit filter, high-end switching power supply, LCD TV, energy saving lamps, electronic ballast, LED lamp and etc.
footprint WCAP-ATLL 13x20x5x0.6
pins: 1, 2

## WCAP-ATLL 13x25x5x0.6 860160278042
designator C?, comment 3300 μF
WCAP-ATLL Aluminum Electrolytic Capacitors , 3300 μF; + / - 20%; 10 V , 13 x 25; Manufacturer: Wurth Elektronik; partNo: 860160278042; E-mail: libraries@we-online.com; Characteristics: Aluminum Electrolytic Capacitor;Recommended soldering: Wave;Operating temperature: –55 °C to +105 °C;Low impedance and high temperature product series;Load life: 3000–10000 h @ +105 °C; ComponentLink1Description: Manufacturer; ComponentLink1URL: http://www.we-online.com; ComponentLink2Description: Datasheet; ComponentLink2URL: http://katalog.we-online.de/pbs/datasheet/860160278042.pdf; Created by: Karrer Zheng; Created Date: 5/13/2015; Capacitance: 3300 μF; Application: Used in circuit with rigorous conditions and high ambient temperature;  applied to the secondary side output filtering loop, used in switching power supply with higher operating temperature, DC-DC converter, AC-DC converter, adapter, charger, TV, VCR, DC motor circuit filter, high-end switching power supply, LCD TV, energy saving lamps, electronic ballast, LED lamp and etc.
footprint WCAP-ATLL 13x25x5x0.6
pins: 1, 2

## WCAP-ATLL 13x25x5x0.6 860160278043
designator C?, comment 3900 μF
WCAP-ATLL Aluminum Electrolytic Capacitors , 3900 μF; + / - 20%; 10 V , 13 x 25; Manufacturer: Wurth Elektronik; partNo: 860160278043; E-mail: libraries@we-online.com; Characteristics: Aluminum Electrolytic Capacitor;Recommended soldering: Wave;Operating temperature: –55 °C to +105 °C;Low impedance and high temperature product series;Load life: 3000–10000 h @ +105 °C; ComponentLink1Description: Manufacturer; ComponentLink1URL: http://www.we-online.com; ComponentLink2Description: Datasheet; ComponentLink2URL: http://katalog.we-online.de/pbs/datasheet/860160278043.pdf; Created by: Karrer Zheng; Created Date: 5/13/2015; Capacitance: 3900 μF; Application: Used in circuit with rigorous conditions and high ambient temperature;  applied to the secondary side output filtering loop, used in switching power supply with higher operating temperature, DC-DC converter, AC-DC converter, adapter, charger, TV, VCR, DC motor circuit filter, high-end switching power supply, LCD TV, energy saving lamps, electronic ballast, LED lamp and etc.
footprint WCAP-ATLL 13x25x5x0.6
pins: 1, 2

## WCAP-ATLL 13x30x5x0.6 860160278044
designator C?, comment 4700 μF
WCAP-ATLL Aluminum Electrolytic Capacitors , 4700 μF; + / - 20%; 10 V , 13 x 30; Manufacturer: Wurth Elektronik; partNo: 860160278044; E-mail: libraries@we-online.com; Characteristics: Aluminum Electrolytic Capacitor;Recommended soldering: Wave;Operating temperature: –55 °C to +105 °C;Low impedance and high temperature product series;Load life: 3000–10000 h @ +105 °C; ComponentLink1Description: Manufacturer; ComponentLink1URL: http://www.we-online.com; ComponentLink2Description: Datasheet; ComponentLink2URL: http://katalog.we-online.de/pbs/datasheet/860160278044.pdf; Created by: Karrer Zheng; Created Date: 5/13/2015; Capacitance: 4700 μF; Application: Used in circuit with rigorous conditions and high ambient temperature;  applied to the secondary side output filtering loop, used in switching power supply with higher operating temperature, DC-DC converter, AC-DC converter, adapter, charger, TV, VCR, DC motor circuit filter, high-end switching power supply, LCD TV, energy saving lamps, electronic ballast, LED lamp and etc.
footprint WCAP-ATLL 13x30x5x0.6
pins: 1, 2

## WCAP-ATLL 13x35x5x0.6 860160278046
designator C?, comment 5600 μF
WCAP-ATLL Aluminum Electrolytic Capacitors , 5600 μF; + / - 20%; 10 V , 13 x 35; Manufacturer: Wurth Elektronik; partNo: 860160278046; E-mail: libraries@we-online.com; Characteristics: Aluminum Electrolytic Capacitor;Recommended soldering: Wave;Operating temperature: –55 °C to +105 °C;Low impedance and high temperature product series;Load life: 3000–10000 h @ +105 °C; ComponentLink1Description: Manufacturer; ComponentLink1URL: http://www.we-online.com; ComponentLink2Description: Datasheet; ComponentLink2URL: http://katalog.we-online.de/pbs/datasheet/860160278046.pdf; Created by: Karrer Zheng; Created Date: 5/13/2015; Capacitance: 5600 μF; Application: Used in circuit with rigorous conditions and high ambient temperature;  applied to the secondary side output filtering loop, used in switching power supply with higher operating temperature, DC-DC converter, AC-DC converter, adapter, charger, TV, VCR, DC motor circuit filter, high-end switching power supply, LCD TV, energy saving lamps, electronic ballast, LED lamp and etc.
footprint WCAP-ATLL 13x35x5x0.6
pins: 1, 2

## WCAP-ATLL 16x25x7.5x0.8 860160280045
designator C?, comment 4700 μF
WCAP-ATLL Aluminum Electrolytic Capacitors , 4700 μF; + / - 20%; 10 V , 16 x 25; Manufacturer: Wurth Elektronik; partNo: 860160280045; E-mail: libraries@we-online.com; Characteristics: Aluminum Electrolytic Capacitor;Recommended soldering: Wave;Operating temperature: –55 °C to +105 °C;Low impedance and high temperature product series;Load life: 3000–10000 h @ +105 °C; ComponentLink1Description: Manufacturer; ComponentLink1URL: http://www.we-online.com; ComponentLink2Description: Datasheet; ComponentLink2URL: http://katalog.we-online.de/pbs/datasheet/860160280045.pdf; Created by: Karrer Zheng; Created Date: 5/13/2015; Capacitance: 4700 μF; Application: Used in circuit with rigorous conditions and high ambient temperature;  applied to the secondary side output filtering loop, used in switching power supply with higher operating temperature, DC-DC converter, AC-DC converter, adapter, charger, TV, VCR, DC motor circuit filter, high-end switching power supply, LCD TV, energy saving lamps, electronic ballast, LED lamp and etc.
footprint WCAP-ATLL 16x25x7.5x0.8
pins: 1, 2

## WCAP-ATLL 16x31.5x7.5x0.8 860160280047
designator C?, comment 5600 μF
WCAP-ATLL Aluminum Electrolytic Capacitors , 5600 μF; + / - 20%; 10 V , 16 x 31,5; Manufacturer: Wurth Elektronik; partNo: 860160280047; E-mail: libraries@we-online.com; Characteristics: Aluminum Electrolytic Capacitor;Recommended soldering: Wave;Operating temperature: –55 °C to +105 °C;Low impedance and high temperature product series;Load life: 3000–10000 h @ +105 °C; ComponentLink1Description: Manufacturer; ComponentLink1URL: http://www.we-online.com; ComponentLink2Description: Datasheet; ComponentLink2URL: http://katalog.we-online.de/pbs/datasheet/860160280047.pdf; Created by: Karrer Zheng; Created Date: 5/13/2015; Capacitance: 5600 μF; Application: Used in circuit with rigorous conditions and high ambient temperature;  applied to the secondary side output filtering loop, used in switching power supply with higher operating temperature, DC-DC converter, AC-DC converter, adapter, charger, TV, VCR, DC motor circuit filter, high-end switching power supply, LCD TV, energy saving lamps, electronic ballast, LED lamp and etc.
footprint WCAP-ATLL 16x31.5x7.5x0.8
pins: 1, 2

## WCAP-ATLL 16x31.5x7.5x0.8 860160280048
designator C?, comment 6800 μF
WCAP-ATLL Aluminum Electrolytic Capacitors , 6800 μF; + / - 20%; 10 V , 16 x 31,5; Manufacturer: Wurth Elektronik; partNo: 860160280048; E-mail: libraries@we-online.com; Characteristics: Aluminum Electrolytic Capacitor;Recommended soldering: Wave;Operating temperature: –55 °C to +105 °C;Low impedance and high temperature product series;Load life: 3000–10000 h @ +105 °C; ComponentLink1Description: Manufacturer; ComponentLink1URL: http://www.we-online.com; ComponentLink2Description: Datasheet; ComponentLink2URL: http://katalog.we-online.de/pbs/datasheet/860160280048.pdf; Created by: Karrer Zheng; Created Date: 5/13/2015; Capacitance: 6800 μF; Application: Used in circuit with rigorous conditions and high ambient temperature;  applied to the secondary side output filtering loop, used in switching power supply with higher operating temperature, DC-DC converter, AC-DC converter, adapter, charger, TV, VCR, DC motor circuit filter, high-end switching power supply, LCD TV, energy saving lamps, electronic ballast, LED lamp and etc.
footprint WCAP-ATLL 16x31.5x7.5x0.8
pins: 1, 2

